# Altium footprint library myPcbLib.PcbLib: 987 footprints (part 6 of 62)
Each footprint in its own frame and in the unit in brackets; x right, y up, seen from the top. Pads: shape width x height; smd on the part's side, far side on the other; paste and mask are expansions set on the pad; w line width, h text height; cw(c..) or ccw(c..) is an arc to the next point about the centre after c.
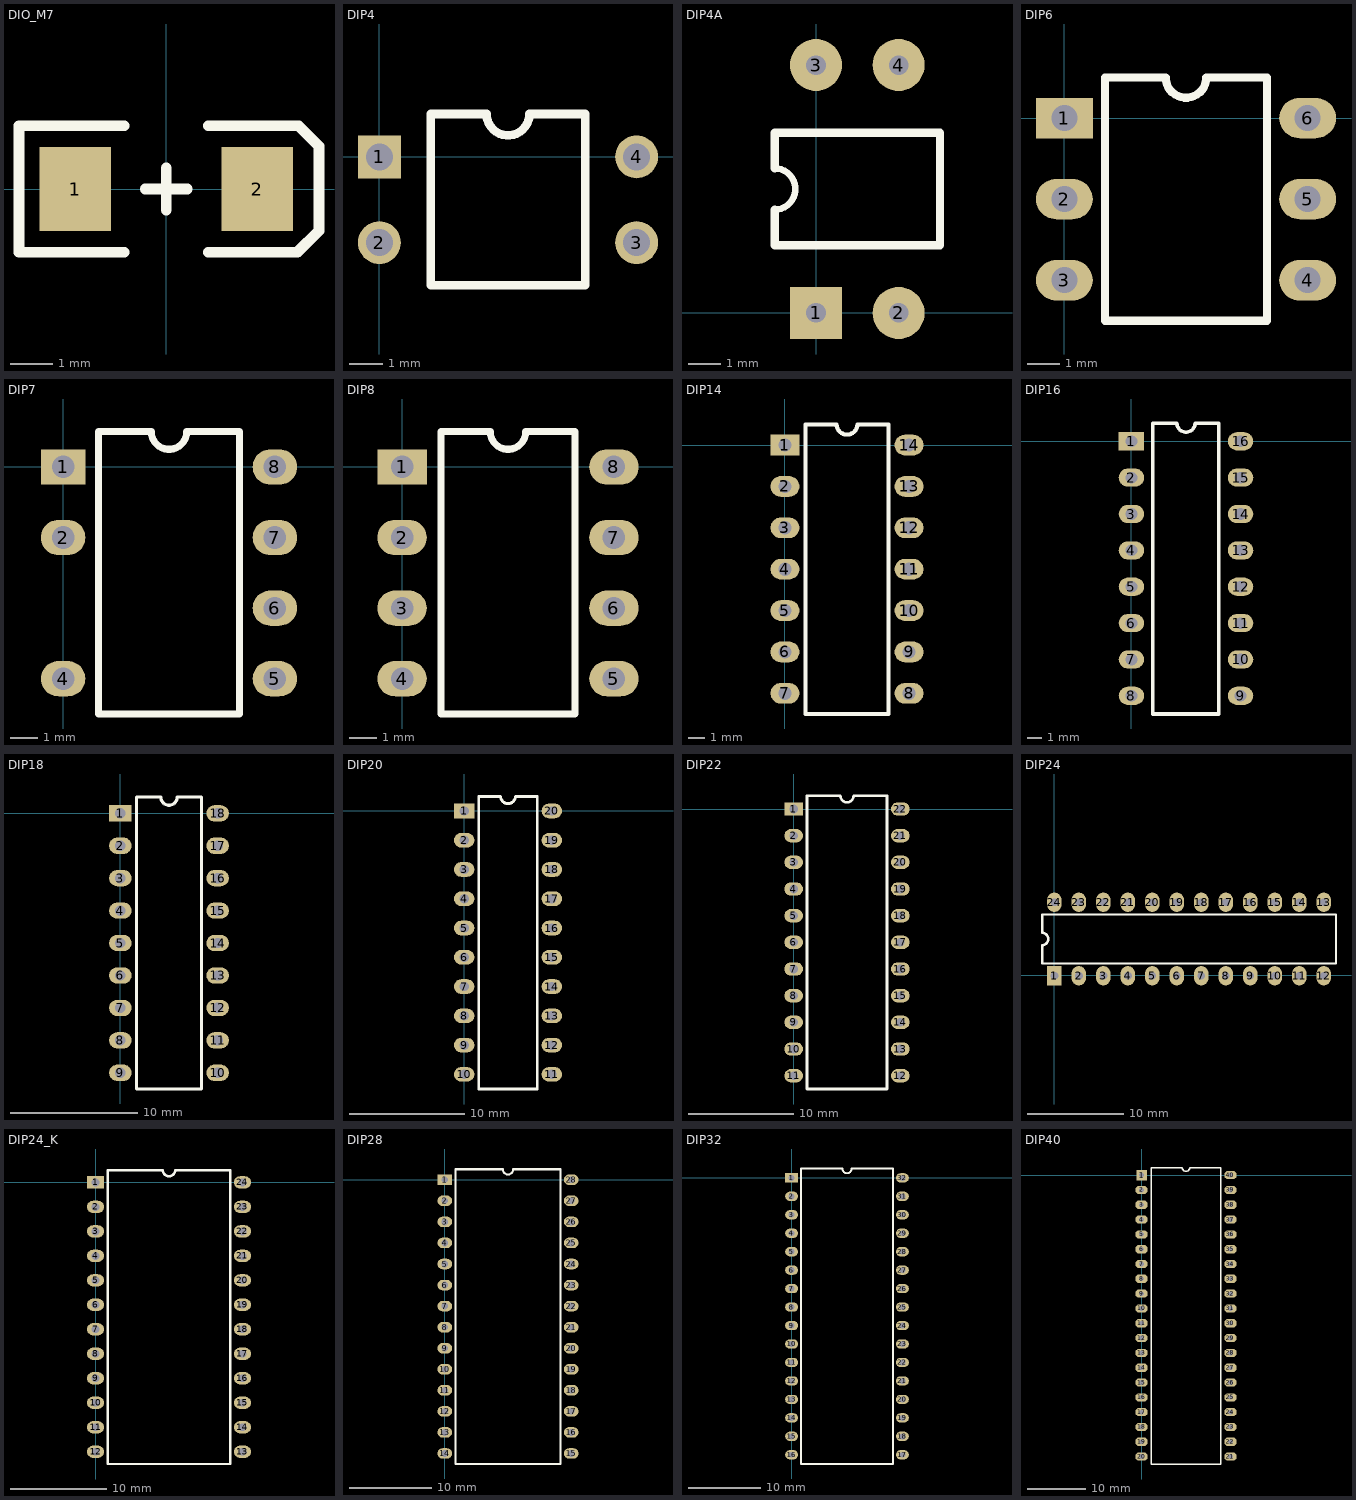
[diagram p5: the footprints below, top view; thin cyan lines are the x and y axes]

## DIO_M7 [mm] "Molded Diode, 2-Leads, Body 4.2x2.7mm, IPC Medium Density"
height 5.28
pads (2):
  rect 1.7x2 smd: 1(-2.159,0) 2(2.159,0)
Top Overlay:
  lines w0.254: -1,-1.5 -3.5,-1.5 -3.5,1.5 -1,1.5 ; -0.5,0 0.5,0 ; 0,-0.5 0,0.5 ; 1,-1.5 3.123,-1.5 3.632,-0.991 3.632,1.016 3.148,1.5 1,1.5

## DIP4 [mm]
pads (4):
  rect 1.27x1.27 hole 0.8: 1(0,0)
  round 1.27 hole 0.8: 2(0,-2.54) 3(7.62,-2.54) 4(7.62,0)
Top Overlay:
  lines w0.254: 1.524,-3.81 6.096,-3.81 6.096,1.27 4.445,1.27 cw(c3.81,1.27) 3.175,1.27 1.524,1.27 1.524,-3.81

## DIP4A [mm]
pads (4):
  rect 1.6x1.6 hole 0.6: 1(0,0)
  round 1.6 hole 0.6: 2(2.54,0) 3(0,7.62) 4(2.54,7.62)
Top Overlay:
  lines w0.2: -1.27,3.175 ccw(c-1.27,3.81) -1.27,4.445
  lines w0.254: -1.27,3.175 -1.27,2.085 3.81,2.085 3.81,5.535 -1.27,5.535 -1.27,4.445

## DIP6 [mil]
pads (6):
  rect 70x50 hole 32: 1(0,0)
  oval 70x50 hole 32: 2(0,-100) 3(0,-200) 4(300,-200) 5(300,-100) 6(300,0)
Top Overlay:
  lines w10: 50,-250 50,50 125,50 ccw(c150,50) 175,50 250,50 250,-250 50,-250

## DIP7 [mm]
pads (7):
  rect 1.6x1.27 hole 0.813: 1(0,0)
  oval 1.6x1.27 hole 0.813: 2(0,-2.54) 4(0,-7.62) 5(7.62,-7.62) 6(7.62,-5.08) 7(7.62,-2.54) 8(7.62,0)
Top Overlay:
  lines w0.254: 1.27,-8.89 6.35,-8.89 6.35,1.27 4.445,1.27 cw(c3.81,1.27) 3.175,1.27 1.27,1.27 1.27,-8.89

## DIP8 [mil]
pads (8):
  rect 70x50 hole 32: 1(0,0)
  oval 70x50 hole 32: 2(0,-100) 3(0,-200) 4(0,-300) 5(300,-300) 6(300,-200) 7(300,-100) 8(300,0)
Top Overlay:
  lines w10: 55,-350 55,50 125,50 ccw(c150,50) 175,50 245,50 245,-350 55,-350

## DIP14 [mil]
pads (14):
  rect 70x50 hole 32: 1(0,0)
  oval 70x50 hole 32: 2(0,-100) 3(0,-200) 4(0,-300) 5(0,-400) 6(0,-500) 7(0,-600) 8(300,-600) 9(300,-500) 10(300,-400) 11(300,-300) 12(300,-200) 13(300,-100) 14(300,0)
Top Overlay:
  lines w10: 50,-650 250,-650 250,50 175,50 cw(c150,50) 125,50 50,50 50,-650

## DIP16 [mil]
pads (16):
  rect 70x50 hole 32: 1(0,0)
  oval 70x50 hole 32: 2(0,-100) 3(0,-200) 4(0,-300) 5(0,-400) 6(0,-500) 7(0,-600) 8(0,-700) 9(300,-700) 10(300,-600) 11(300,-500) 12(300,-400) 13(300,-300) 14(300,-200) 15(300,-100) 16(300,0)
Top Overlay:
  lines w10: 59.06,-750 240.16,-750 240.16,50 175,50 cw(c150,50) 125,50 59.06,50 59.06,-750

## DIP18 [mil]
pads (18):
  rect 70x50 hole 32: 1(0,0)
  oval 70x50 hole 32: 2(0,-100) 3(0,-200) 4(0,-300) 5(0,-400) 6(0,-500) 7(0,-600) 8(0,-700) 9(0,-800) 10(300,-800) 11(300,-700) 12(300,-600) 13(300,-500) 14(300,-400) 15(300,-300) 16(300,-200) 17(300,-100) 18(300,0)
Top Overlay:
  lines w10: 50,-850 250,-850 250,50 175,50 cw(c150,50) 125,50 50,50 50,-850

## DIP20 [mil]
pads (20):
  rect 70x50 hole 32: 1(0,0)
  oval 70x50 hole 32: 2(0,-100) 3(0,-200) 4(0,-300) 5(0,-400) 6(0,-500) 7(0,-600) 8(0,-700) 9(0,-800) 10(0,-900) 11(300,-900) 12(300,-800) 13(300,-700) 14(300,-600) 15(300,-500) 16(300,-400) 17(300,-300) 18(300,-200) 19(300,-100) 20(300,0)
Top Overlay:
  lines w10: 50,-950 50,50 125,50 ccw(c150,50) 175,50 250,50 250,-950 50,-950

## DIP22 [mil]
pads (22):
  rect 70x50 hole 32: 1(0,0)
  oval 70x50 hole 32: 2(0,-100) 3(0,-200) 4(0,-300) 5(0,-400) 6(0,-500) 7(0,-600) 8(0,-700) 9(0,-800) 10(0,-900) 11(0,-1000) 12(400,-1000) 13(400,-900) 14(400,-800) 15(400,-700) 16(400,-600) 17(400,-500) 18(400,-400) 19(400,-300) 20(400,-200) 21(400,-100) 22(400,0)
Top Overlay:
  lines w10: 50,-1050 350,-1050 350,50 225,50 cw(c200,50) 175,50 50,50 50,-1050

## DIP24 [mm]
pads (24):
  rect 1.5x2 hole 0.813: 1(0,-0.05)
  oval 1.5x2 hole 0.813: 2(2.54,-0.05) 3(5.08,-0.05) 4(7.62,-0.05) 5(10.16,-0.05) 6(12.7,-0.05) 7(15.24,-0.05) 8(17.78,-0.05) 9(20.32,-0.05) 10(22.86,-0.05) 11(25.4,-0.05) 12(27.94,-0.05) 13(27.94,7.57) 14(25.4,7.57) 15(22.86,7.57) 16(20.32,7.57) 17(17.78,7.57) 18(15.24,7.57) 19(12.7,7.57) 20(10.16,7.57) 21(7.62,7.57) 22(5.08,7.57) 23(2.54,7.57) 24(0,7.57)
Top Overlay:
  lines w0.254: -1.27,1.22 29.21,1.22 29.21,6.3 -1.27,6.3 -1.27,4.395 cw(c-1.27,3.76) -1.27,3.125 -1.27,1.22

## DIP24_K [mil]
pads (24):
  rect 70x50 hole 32: 1(0,0)
  oval 70x50 hole 32: 2(0,-100) 3(0,-200) 4(0,-300) 5(0,-400) 6(0,-500) 7(0,-600) 8(0,-700) 9(0,-800) 10(0,-900) 11(0,-1000) 12(0,-1100) 13(600,-1100) 14(600,-1000) 15(600,-900) 16(600,-800) 17(600,-700) 18(600,-600) 19(600,-500) 20(600,-400) 21(600,-300) 22(600,-200) 23(600,-100) 24(600,0)
Top Overlay:
  lines w10: 50,-1150 50,50 275,50 ccw(c300,50) 325,50 550,50 550,-1150 50,-1150

## DIP28 [mil]
pads (28):
  rect 70x50 hole 32: 1(0,0)
  oval 70x50 hole 32: 2(0,-100) 3(0,-200) 4(0,-300) 5(0,-400) 6(0,-500) 7(0,-600) 8(0,-700) 9(0,-800) 10(0,-900) 11(0,-1000) 12(0,-1100) 13(0,-1200) 14(0,-1300) 15(600,-1300) 16(600,-1200) 17(600,-1100) 18(600,-1000) 19(600,-900) 20(600,-800) 21(600,-700) 22(600,-600) 23(600,-500) 24(600,-400) 25(600,-300) 26(600,-200) 27(600,-100) 28(600,0)
Top Overlay:
  lines w10: 50,-1350 50,50 275,50 ccw(c300,50) 325,50 550,50 550,-1350 50,-1350

## DIP32 [mil]
pads (32):
  rect 70x50 hole 32: 1(0,0)
  oval 70x50 hole 32: 2(0,-100) 3(0,-200) 4(0,-300) 5(0,-400) 6(0,-500) 7(0,-600) 8(0,-700) 9(0,-800) 10(0,-900) 11(0,-1000) 12(0,-1100) 13(0,-1200) 14(0,-1300) 15(0,-1400) 16(0,-1500) 17(600,-1500) 18(600,-1400) 19(600,-1300) 20(600,-1200) 21(600,-1100) 22(600,-1000) 23(600,-900) 24(600,-800) 25(600,-700) 26(600,-600) 27(600,-500) 28(600,-400) 29(600,-300) 30(600,-200) 31(600,-100) 32(600,0)
Top Overlay:
  lines w10: 50,-1550 550,-1550 550,50 325,50 cw(c300,50) 275,50 50,50 50,-1550

## DIP40 [mm]
pads (40):
  rect 1.8x1.8 hole 0.813: 1(0,0)
  oct 2x1.4 hole 0.813: 2(0,-2.54) 3(0,-5.08) 4(0,-7.62) 5(0,-10.16) 6(0,-12.7) 7(0,-15.24) 8(0,-17.78) 9(0,-20.32) 10(0,-22.86) 11(0,-25.4) 12(0,-27.94) 13(0,-30.48) 14(0,-33.02) 15(0,-35.56) 16(0,-38.1) 17(0,-40.64) 18(0,-43.18) 19(0,-45.72) 20(0,-48.26) 21(15.24,-48.26) 22(15.24,-45.72) 23(15.24,-43.18) 24(15.24,-40.64) 25(15.24,-38.1) 26(15.24,-35.56) 27(15.24,-33.02) 28(15.24,-30.48) 29(15.24,-27.94) 30(15.24,-25.4) 31(15.24,-22.86) 32(15.24,-20.32) 33(15.24,-17.78) 34(15.24,-15.24) 35(15.24,-12.7) 36(15.24,-10.16) 37(15.24,-7.62) 38(15.24,-5.08) 39(15.24,-2.54) 40(15.24,0)
Top Overlay:
  lines w0.254: 1.651,-49.53 1.651,1.27 6.985,1.27 ccw(c7.62,1.27) 8.255,1.27 13.589,1.27 13.589,-49.53 1.651,-49.53